# Altium footprint library Molex FFC - FPC Connectors (SMT).PcbLib: 638 footprints (part 33 of 40)
Each footprint in its own frame and in the unit in brackets; x right, y up, seen from the top. Pads: shape width x height; smd on the part's side, far side on the other; paste and mask are expansions set on the pad; w line width, h text height; cw(c..) or ccw(c..) is an arc to the next point about the centre after c.
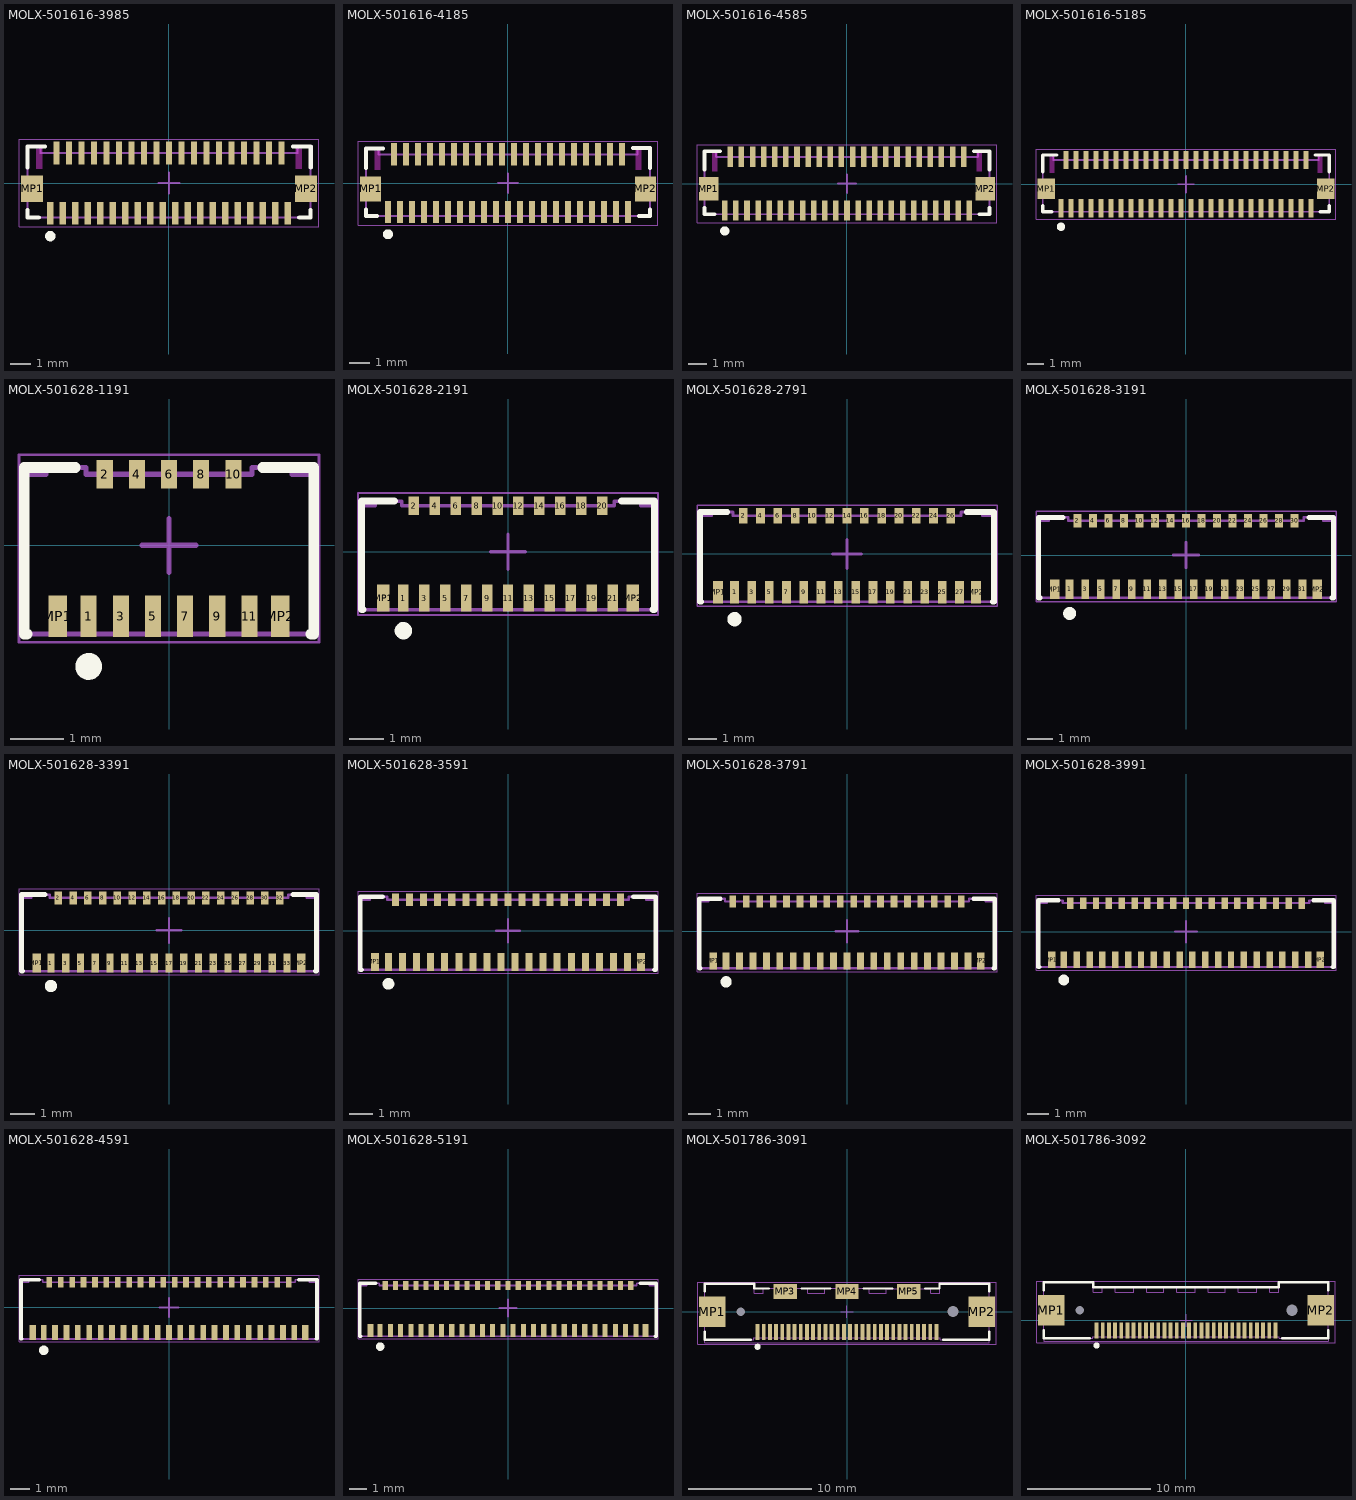
[diagram p32: the footprints below, top view; thin cyan lines are the x and y axes]

## MOLX-501616-3985 [mm] "FPC Connector, 39-Leads, Right Angle, Pitch 0.3 mm, Mated Height 1.1 mm, SMT"
height 1.112
pads (41):
  rect 0.3x1.1 smd: 1(-5.7,-1.45) 2(-5.4,1.45) 3(-5.1,-1.45) 4(-4.8,1.45) 5(-4.5,-1.45) 6(-4.2,1.45) 7(-3.9,-1.45) 8(-3.6,1.45) 9(-3.3,-1.45) 10(-3,1.45) 11(-2.7,-1.45) 12(-2.4,1.45) 13(-2.1,-1.45) 14(-1.8,1.45) 15(-1.5,-1.45) 16(-1.2,1.45) 17(-0.9,-1.45) 18(-0.6,1.45) 19(-0.3,-1.45) 20(0,1.45) 21(0.3,-1.45) 22(0.6,1.45) 23(0.9,-1.45) 24(1.2,1.45) 25(1.5,-1.45) 26(1.8,1.45) 27(2.1,-1.45) 28(2.4,1.45) 29(2.7,-1.45) 30(3,1.45) 31(3.3,-1.45) 32(3.6,1.45) 33(3.9,-1.45) 34(4.2,1.45) 35(4.5,-1.45) 36(4.8,1.45) 37(5.1,-1.45) 38(5.4,1.45) 39(5.7,-1.45)
  rect 1.05x1.25 smd: MP1(-6.575,-0.275) MP2(6.575,-0.275)
Top Overlay:
  circle w0.25: c-5.7,-2.55 r0.125
  lines w0.2: -6.8,-1.3 -6.8,-1.65 -6.25,-1.65 ; -6.8,0.75 -6.8,1.75 -5.95,1.75 ; 5.95,1.75 6.8,1.75 6.8,0.75 ; 6.25,-1.65 6.8,-1.65 6.8,-1.3
Keep-Out Layer:
  rectangle: 6.08,0.67 6.38,1.78
  rectangle: -6.38,0.67 -6.08,1.78
Mechanical 13:
  lines w0.1: -6.8,-1.65 -6.8,1.75 -6.17,1.75 -6.17,1.45 6.17,1.45 6.17,1.75 6.8,1.75 6.8,-1.65 -6.8,-1.65
Mechanical 15:
  lines w0.05: -7.2,-2.1 7.2,-2.1 7.2,2.1 -7.2,2.1 -7.2,-2.1
  lines w0.1: -0.5,0 0.5,0 ; 0,-0.5 0,0.5
3D body: height 0.25, standoff 0, extent -6.8,-1.7 6.8,1.75

## MOLX-501616-4185 [mm] "FPC Connector, 41-Leads, Right Angle, Pitch 0.3 mm, Mated Height 1.1 mm, SMT"
height 1.112
pads (43):
  rect 0.3x1.1 smd: 1(-6,-1.45) 2(-5.7,1.45) 3(-5.4,-1.45) 4(-5.1,1.45) 5(-4.8,-1.45) 6(-4.5,1.45) 7(-4.2,-1.45) 8(-3.9,1.45) 9(-3.6,-1.45) 10(-3.3,1.45) 11(-3,-1.45) 12(-2.7,1.45) 13(-2.4,-1.45) 14(-2.1,1.45) 15(-1.8,-1.45) 16(-1.5,1.45) 17(-1.2,-1.45) 18(-0.9,1.45) 19(-0.6,-1.45) 20(-0.3,1.45) 21(0,-1.45) 22(0.3,1.45) 23(0.6,-1.45) 24(0.9,1.45) 25(1.2,-1.45) 26(1.5,1.45) 27(1.8,-1.45) 28(2.1,1.45) 29(2.4,-1.45) 30(2.7,1.45) 31(3,-1.45) 32(3.3,1.45) 33(3.6,-1.45) 34(3.9,1.45) 35(4.2,-1.45) 36(4.5,1.45) 37(4.8,-1.45) 38(5.1,1.45) 39(5.4,-1.45) 40(5.7,1.45) 41(6,-1.45)
  rect 1.05x1.25 smd: MP1(-6.875,-0.275) MP2(6.875,-0.275)
Top Overlay:
  circle w0.25: c-6,-2.55 r0.125
  lines w0.2: -7.1,-1.3 -7.1,-1.65 -6.55,-1.65 ; -7.1,0.75 -7.1,1.75 -6.25,1.75 ; 6.25,1.75 7.1,1.75 7.1,0.75 ; 6.55,-1.65 7.1,-1.65 7.1,-1.3
Keep-Out Layer:
  rectangle: -6.68,0.67 -6.38,1.78
  rectangle: 6.38,0.67 6.68,1.78
Mechanical 13:
  lines w0.1: -7.1,-1.65 7.1,-1.65 7.1,1.75 6.47,1.75 6.47,1.45 -6.47,1.45 ; -7.1,1.75 -6.47,1.75 ; -7.1,-1.65 -7.1,1.75 ; -6.47,1.45 -6.47,1.75
Mechanical 15:
  lines w0.05: -7.5,-2.1 -7.5,2.1 7.5,2.1 7.5,-2.1 -7.5,-2.1
  lines w0.1: -0.5,0 0.5,0 ; 0,-0.5 0,0.5
3D body: height 0.25, standoff 0, extent -7.1,-1.7 7.1,1.75

## MOLX-501616-4585 [mm] "FPC Connector, 45-Leads, Right Angle, Pitch 0.3 mm, Mated Height 1.1 mm, SMT"
height 1.112
pads (47):
  rect 0.3x1.1 smd: 1(-6.6,-1.45) 2(-6.3,1.45) 3(-6,-1.45) 4(-5.7,1.45) 5(-5.4,-1.45) 6(-5.1,1.45) 7(-4.8,-1.45) 8(-4.5,1.45) 9(-4.2,-1.45) 10(-3.9,1.45) 11(-3.6,-1.45) 12(-3.3,1.45) 13(-3,-1.45) 14(-2.7,1.45) 15(-2.4,-1.45) 16(-2.1,1.45) 17(-1.8,-1.45) 18(-1.5,1.45) 19(-1.2,-1.45) 20(-0.9,1.45) 21(-0.6,-1.45) 22(-0.3,1.45) 23(0,-1.45) 24(0.3,1.45) 25(0.6,-1.45) 26(0.9,1.45) 27(1.2,-1.45) 28(1.5,1.45) 29(1.8,-1.45) 30(2.1,1.45) 31(2.4,-1.45) 32(2.7,1.45) 33(3,-1.45) 34(3.3,1.45) 35(3.6,-1.45) 36(3.9,1.45) 37(4.2,-1.45) 38(4.5,1.45) 39(4.8,-1.45) 40(5.1,1.45) 41(5.4,-1.45) 42(5.7,1.45) 43(6,-1.45) 44(6.3,1.45) 45(6.6,-1.45)
  rect 1.05x1.25 smd: MP1(-7.475,-0.275) MP2(7.475,-0.275)
Top Overlay:
  circle w0.25: c-6.6,-2.55 r0.125
  lines w0.2: -7.7,-1.3 -7.7,-1.65 -7.15,-1.65 ; -7.7,0.75 -7.7,1.75 -6.85,1.75 ; 6.85,1.75 7.7,1.75 7.7,0.75 ; 7.15,-1.65 7.7,-1.65 7.7,-1.3
Keep-Out Layer:
  rectangle: -7.28,0.67 -6.98,1.78
  rectangle: 6.98,0.67 7.28,1.78
Mechanical 13:
  lines w0.1: -7.7,-1.65 7.7,-1.65 7.7,1.75 7.07,1.75 7.07,1.45 -7.07,1.45 -7.07,1.75 -7.7,1.75 -7.7,-1.65
Mechanical 15:
  lines w0.05: -8.1,-2.1 -8.1,2.1 8.1,2.1 8.1,-2.1 -8.1,-2.1
  lines w0.1: -0.5,0 0.5,0 ; 0,-0.5 0,0.5
3D body: height 0.25, standoff 0, extent -7.7,-1.7 7.7,1.75

## MOLX-501616-5185 [mm] "FPC Connector, 51-Leads, Right Angle, Pitch 0.3 mm, Mated Height 1.1 mm, SMT"
height 1.112
pads (53):
  rect 0.3x1.1 smd: 1(-7.5,-1.45) 2(-7.2,1.45) 3(-6.9,-1.45) 4(-6.6,1.45) 5(-6.3,-1.45) 6(-6,1.45) 7(-5.7,-1.45) 8(-5.4,1.45) 9(-5.1,-1.45) 10(-4.8,1.45) 11(-4.5,-1.45) 12(-4.2,1.45) 13(-3.9,-1.45) 14(-3.6,1.45) 15(-3.3,-1.45) 16(-3,1.45) 17(-2.7,-1.45) 18(-2.4,1.45) 19(-2.1,-1.45) 20(-1.8,1.45) 21(-1.5,-1.45) 22(-1.2,1.45) 23(-0.9,-1.45) 24(-0.6,1.45) 25(-0.3,-1.45) 26(0,1.45) 27(0.3,-1.45) 28(0.6,1.45) 29(0.9,-1.45) 30(1.2,1.45) 31(1.5,-1.45) 32(1.8,1.45) 33(2.1,-1.45) 34(2.4,1.45) 35(2.7,-1.45) 36(3,1.45) 37(3.3,-1.45) 38(3.6,1.45) 39(3.9,-1.45) 40(4.2,1.45) 41(4.5,-1.45) 42(4.8,1.45) 43(5.1,-1.45) 44(5.4,1.45) 45(5.7,-1.45) 46(6,1.45) 47(6.3,-1.45) 48(6.6,1.45) 49(6.9,-1.45) 50(7.2,1.45) 51(7.5,-1.45)
  rect 1.05x1.25 smd: MP1(-8.375,-0.275) MP2(8.375,-0.275)
Top Overlay:
  circle w0.25: c-7.5,-2.55 r0.125
  lines w0.2: -8.6,-1.3 -8.6,-1.65 -8.05,-1.65 ; -8.6,0.75 -8.6,1.75 -7.75,1.75 ; 7.75,1.75 8.6,1.75 8.6,0.75 ; 8.05,-1.65 8.6,-1.65 8.6,-1.3
Keep-Out Layer:
  rectangle: -8.18,0.67 -7.88,1.78
  rectangle: 7.88,0.67 8.18,1.78
Mechanical 13:
  lines w0.1: -8.6,-1.65 8.6,-1.65 8.6,1.75 7.97,1.75 7.97,1.45 -7.97,1.45 -7.97,1.75 -8.6,1.75 ; -8.6,-1.65 -8.6,1.75
Mechanical 15:
  lines w0.05: -9,-2.1 -9,2.1 9,2.1 9,-2.1 -9,-2.1
  lines w0.1: -0.5,0 0.5,0 ; 0,-0.5 0,0.5
3D body: height 0.25, standoff 0, extent -8.6,-1.7 8.6,1.75

## MOLX-501628-1191 [mm] "FPC Connector, 11-Leads, Right Angle, Pitch 0.3 mm, Mated Height 0.9 mm, SMT"
height 0.912
pads (13):
  rect 0.3x0.77 smd: 1(-1.5,-1.325) 3(-0.9,-1.325) 5(-0.3,-1.325) 7(0.3,-1.325) 9(0.9,-1.325) 11(1.5,-1.325)
  rect 0.3x0.53 smd: 2(-1.2,1.325) 4(-0.6,1.325) 6(0,1.325) 8(0.6,1.325) 10(1.2,1.325)
  rect 0.35x0.77 smd: MP1(-2.075,-1.325) MP2(2.075,-1.325)
Top Overlay:
  circle w0.25: c-1.5,-2.26 r0.125
  lines w0.2: -2.65,-1.655 -2.7,-1.655 -2.7,1.455 -1.75,1.455 ; 1.75,1.455 2.7,1.455 2.7,-1.655 2.65,-1.655 ; -2.3,1.455 -2.3,1.455
Mechanical 13:
  lines w0.1: 2.4,-1.655 2.7,-1.655 ; 2.7,-1.655 -2.4,-1.655 -2.7,-1.655 -2.7,1.325 -2.3,1.325 -2.3,1.455 -1.55,1.455 -1.55,1.325 1.55,1.325 1.55,1.455 2.3,1.455 2.3,1.325 2.7,1.325 2.7,-1.655
Mechanical 15:
  lines w0.05: -2.8,-1.81 -2.8,1.69 2.8,1.69 2.8,-1.81 -2.8,-1.81
  lines w0.1: -0.5,0 0.5,0 ; 0,-0.5 0,0.5
3D body: height 0.25, standoff 0, extent -2.7,-1.655 2.7,1.455

## MOLX-501628-2191 [mm] "FPC Connector, 21-Leads, Right Angle, Pitch 0.3 mm, Mated Height 0.9 mm, SMT"
height 0.912
pads (23):
  rect 0.3x0.77 smd: 1(-3,-1.325) 3(-2.4,-1.325) 5(-1.8,-1.325) 7(-1.2,-1.325) 9(-0.6,-1.325) 11(0,-1.325) 13(0.6,-1.325) 15(1.2,-1.325) 17(1.8,-1.325) 19(2.4,-1.325) 21(3,-1.325)
  rect 0.3x0.53 smd: 2(-2.7,1.325) 4(-2.1,1.325) 6(-1.5,1.325) 8(-0.9,1.325) 10(-0.3,1.325) 12(0.3,1.325) 14(0.9,1.325) 16(1.5,1.325) 18(2.1,1.325) 20(2.7,1.325)
  rect 0.35x0.77 smd: MP1(-3.575,-1.325) MP2(3.575,-1.325)
Top Overlay:
  circle w0.25: c-3,-2.26 r0.125
  lines w0.2: -4.15,-1.655 -4.2,-1.655 -4.2,1.455 -3.25,1.455 ; 3.25,1.455 4.2,1.455 4.2,-1.655 4.15,-1.655 ; -3.8,1.455 -3.8,1.455
Mechanical 13:
  lines w0.1: -4.2,-1.655 -3.9,-1.655 3.9,-1.655 4.2,-1.655 4.2,1.325 3.8,1.325 3.8,1.455 3.05,1.455 3.05,1.325 -3.05,1.325 -3.05,1.455 -3.8,1.455 -3.8,1.325 -4.2,1.325 -4.2,-1.655
Mechanical 15:
  lines w0.05: -4.3,-1.81 4.3,-1.81 4.3,1.69 -4.3,1.69 -4.3,-1.81
  lines w0.1: -0.5,0 0.5,0 ; 0,-0.5 0,0.5
3D body: height 0.25, standoff 0, extent -4.2,-1.655 4.2,1.455

## MOLX-501628-2791 [mm] "FPC Connector, 27-Leads, Right Angle, Pitch 0.3 mm, Mated Height 0.9 mm, SMT"
height 0.912
pads (29):
  rect 0.3x0.77 smd: 1(-3.9,-1.325) 3(-3.3,-1.325) 5(-2.7,-1.325) 7(-2.1,-1.325) 9(-1.5,-1.325) 11(-0.9,-1.325) 13(-0.3,-1.325) 15(0.3,-1.325) 17(0.9,-1.325) 19(1.5,-1.325) 21(2.1,-1.325) 23(2.7,-1.325) 25(3.3,-1.325) 27(3.9,-1.325)
  rect 0.3x0.53 smd: 2(-3.6,1.325) 4(-3,1.325) 6(-2.4,1.325) 8(-1.8,1.325) 10(-1.2,1.325) 12(-0.6,1.325) 14(0,1.325) 16(0.6,1.325) 18(1.2,1.325) 20(1.8,1.325) 22(2.4,1.325) 24(3,1.325) 26(3.6,1.325)
  rect 0.35x0.77 smd: MP1(-4.475,-1.325) MP2(4.475,-1.325)
Top Overlay:
  circle w0.25: c-3.9,-2.26 r0.125
  lines w0.2: -5.05,-1.655 -5.1,-1.655 -5.1,1.455 -4.15,1.455 ; 4.15,1.455 5.1,1.455 5.1,-1.655 5.05,-1.655 ; -4.7,1.455 -4.7,1.455
Mechanical 13:
  lines w0.1: -5.1,-1.655 -5.1,1.325 -4.7,1.325 -4.7,1.455 -3.95,1.455 -3.95,1.325 3.95,1.325 3.95,1.455 4.7,1.455 4.7,1.325 5.1,1.325 5.1,-1.655 4.8,-1.655 -4.8,-1.655 -5.1,-1.655
Mechanical 15:
  lines w0.05: -5.2,-1.81 -5.2,1.69 5.2,1.69 5.2,-1.81 -5.2,-1.81
  lines w0.1: -0.5,0 0.5,0 ; 0,-0.5 0,0.5
3D body: height 0.25, standoff 0, extent -5.1,-1.655 5.1,1.455

## MOLX-501628-3191 [mm] "FPC Connector, 31-Leads, Right Angle, Pitch 0.3 mm, Mated Height 0.9 mm, SMT"
height 0.912
pads (33):
  rect 0.3x0.77 smd: 1(-4.5,-1.325) 3(-3.9,-1.325) 5(-3.3,-1.325) 7(-2.7,-1.325) 9(-2.1,-1.325) 11(-1.5,-1.325) 13(-0.9,-1.325) 15(-0.3,-1.325) 17(0.3,-1.325) 19(0.9,-1.325) 21(1.5,-1.325) 23(2.1,-1.325) 25(2.7,-1.325) 27(3.3,-1.325) 29(3.9,-1.325) 31(4.5,-1.325)
  rect 0.3x0.53 smd: 2(-4.2,1.325) 4(-3.6,1.325) 6(-3,1.325) 8(-2.4,1.325) 10(-1.8,1.325) 12(-1.2,1.325) 14(-0.6,1.325) 16(0,1.325) 18(0.6,1.325) 20(1.2,1.325) 22(1.8,1.325) 24(2.4,1.325) 26(3,1.325) 28(3.6,1.325) 30(4.2,1.325)
  rect 0.35x0.77 smd: MP1(-5.075,-1.325) MP2(5.075,-1.325)
Top Overlay:
  circle w0.25: c-4.5,-2.26 r0.125
  lines w0.2: -5.65,-1.655 -5.7,-1.655 -5.7,1.455 -4.75,1.455 ; 4.75,1.455 5.7,1.455 5.7,-1.655 5.65,-1.655 ; -5.3,1.455 -5.3,1.455
Mechanical 13:
  lines w0.1: -5.7,-1.655 -5.7,1.325 -5.3,1.325 -5.3,1.455 -4.55,1.455 -4.55,1.325 4.55,1.325 4.55,1.455 5.3,1.455 5.3,1.325 5.7,1.325 5.7,-1.655 5.4,-1.655 -5.4,-1.655 -5.7,-1.655
Mechanical 15:
  lines w0.05: -5.8,-1.81 -5.8,1.69 5.8,1.69 5.8,-1.81 -5.8,-1.81
  lines w0.1: -0.5,0 0.5,0 ; 0,-0.5 0,0.5
3D body: height 0.25, standoff 0, extent -5.7,-1.655 5.7,1.455

## MOLX-501628-3391 [mm] "FPC Connector, 33-Leads, Right Angle, Pitch 0.3 mm, Mated Height 0.9 mm, SMT"
height 0.912
pads (35):
  rect 0.3x0.77 smd: 1(-4.8,-1.325) 3(-4.2,-1.325) 5(-3.6,-1.325) 7(-3,-1.325) 9(-2.4,-1.325) 11(-1.8,-1.325) 13(-1.2,-1.325) 15(-0.6,-1.325) 17(0,-1.325) 19(0.6,-1.325) 21(1.2,-1.325) 23(1.8,-1.325) 25(2.4,-1.325) 27(3,-1.325) 29(3.6,-1.325) 31(4.2,-1.325) 33(4.8,-1.325)
  rect 0.3x0.53 smd: 2(-4.5,1.325) 4(-3.9,1.325) 6(-3.3,1.325) 8(-2.7,1.325) 10(-2.1,1.325) 12(-1.5,1.325) 14(-0.9,1.325) 16(-0.3,1.325) 18(0.3,1.325) 20(0.9,1.325) 22(1.5,1.325) 24(2.1,1.325) 26(2.7,1.325) 28(3.3,1.325) 30(3.9,1.325) 32(4.5,1.325)
  rect 0.35x0.77 smd: MP1(-5.375,-1.325) MP2(5.375,-1.325)
Top Overlay:
  circle w0.25: c-4.8,-2.26 r0.125
  lines w0.2: -5.95,-1.655 -6,-1.655 -6,1.455 -5.05,1.455 ; 5.05,1.455 6,1.455 6,-1.655 ; 5.95,-1.655 6,-1.655 ; -5.6,1.455 -5.6,1.455
Mechanical 13:
  lines w0.1: -6,-1.655 -5.7,-1.655 5.7,-1.655 6,-1.655 6,1.325 5.6,1.325 5.6,1.455 4.85,1.455 4.85,1.325 -4.85,1.325 -4.85,1.455 -5.6,1.455 -5.6,1.325 -6,1.325 -6,-1.655
Mechanical 15:
  lines w0.05: -6.1,-1.81 6.1,-1.81 6.1,1.69 -6.1,1.69 -6.1,-1.81
  lines w0.1: -0.5,0 0.5,0 ; 0,-0.5 0,0.5
3D body: height 0.25, standoff 0, extent -6,-1.655 6,1.455

## MOLX-501628-3591 [mm] "FPC Connector, 35-Leads, Right Angle, Pitch 0.3 mm, Mated Height 0.9 mm, SMT"
height 0.912
pads (37):
  rect 0.3x0.77 smd: 1(-5.1,-1.325) 3(-4.5,-1.325) 5(-3.9,-1.325) 7(-3.3,-1.325) 9(-2.7,-1.325) 11(-2.1,-1.325) 13(-1.5,-1.325) 15(-0.9,-1.325) 17(-0.3,-1.325) 19(0.3,-1.325) 21(0.9,-1.325) 23(1.5,-1.325) 25(2.1,-1.325) 27(2.7,-1.325) 29(3.3,-1.325) 31(3.9,-1.325) 33(4.5,-1.325) 35(5.1,-1.325)
  rect 0.3x0.53 smd: 2(-4.8,1.325) 4(-4.2,1.325) 6(-3.6,1.325) 8(-3,1.325) 10(-2.4,1.325) 12(-1.8,1.325) 14(-1.2,1.325) 16(-0.6,1.325) 18(0,1.325) 20(0.6,1.325) 22(1.2,1.325) 24(1.8,1.325) 26(2.4,1.325) 28(3,1.325) 30(3.6,1.325) 32(4.2,1.325) 34(4.8,1.325)
  rect 0.35x0.77 smd: MP1(-5.675,-1.325) MP2(5.675,-1.325)
Top Overlay:
  circle w0.25: c-5.1,-2.26 r0.125
  lines w0.2: -6.25,-1.655 -6.3,-1.655 -6.3,1.455 -5.35,1.455 ; 5.35,1.455 6.3,1.455 6.3,-1.655 6.25,-1.655 ; -5.9,1.455 -5.9,1.455
Mechanical 13:
  lines w0.1: 6,-1.655 6.3,-1.655 ; 6.3,-1.655 -6,-1.655 -6.3,-1.655 -6.3,1.325 -5.9,1.325 -5.9,1.455 -5.15,1.455 -5.15,1.325 5.15,1.325 5.15,1.455 5.9,1.455 5.9,1.325 6.3,1.325 6.3,-1.655
Mechanical 15:
  lines w0.05: -6.4,-1.81 -6.4,1.69 6.4,1.69 6.4,-1.81 -6.4,-1.81
  lines w0.1: -0.5,0 0.5,0 ; 0,-0.5 0,0.5
3D body: height 0.25, standoff 0, extent -6.3,-1.655 6.3,1.455

## MOLX-501628-3791 [mm] "FPC Connector, 37-Leads, Right Angle, Pitch 0.3 mm, Mated Height 0.9 mm, SMT"
height 0.912
pads (39):
  rect 0.3x0.77 smd: 1(-5.4,-1.325) 3(-4.8,-1.325) 5(-4.2,-1.325) 7(-3.6,-1.325) 9(-3,-1.325) 11(-2.4,-1.325) 13(-1.8,-1.325) 15(-1.2,-1.325) 17(-0.6,-1.325) 19(0,-1.325) 21(0.6,-1.325) 23(1.2,-1.325) 25(1.8,-1.325) 27(2.4,-1.325) 29(3,-1.325) 31(3.6,-1.325) 33(4.2,-1.325) 35(4.8,-1.325) 37(5.4,-1.325)
  rect 0.3x0.53 smd: 2(-5.1,1.325) 4(-4.5,1.325) 6(-3.9,1.325) 8(-3.3,1.325) 10(-2.7,1.325) 12(-2.1,1.325) 14(-1.5,1.325) 16(-0.9,1.325) 18(-0.3,1.325) 20(0.3,1.325) 22(0.9,1.325) 24(1.5,1.325) 26(2.1,1.325) 28(2.7,1.325) 30(3.3,1.325) 32(3.9,1.325) 34(4.5,1.325) 36(5.1,1.325)
  rect 0.35x0.77 smd: MP1(-5.975,-1.325) MP2(5.975,-1.325)
Top Overlay:
  circle w0.25: c-5.4,-2.26 r0.125
  lines w0.2: -6.55,-1.655 -6.6,-1.655 -6.6,1.455 -5.65,1.455 ; 5.65,1.455 6.6,1.455 6.6,-1.655 6.55,-1.655 ; -6.2,1.455 -6.2,1.455
Mechanical 13:
  lines w0.1: -6.6,-1.655 -6.6,1.325 -6.2,1.325 -6.2,1.455 -5.45,1.455 -5.45,1.325 5.45,1.325 5.45,1.455 6.2,1.455 6.2,1.325 6.6,1.325 6.6,-1.655 6.3,-1.655 -6.3,-1.655 -6.6,-1.655
Mechanical 15:
  lines w0.05: -6.7,-1.81 -6.7,1.69 6.7,1.69 6.7,-1.81 -6.7,-1.81
  lines w0.1: -0.5,0 0.5,0 ; 0,-0.5 0,0.5
3D body: height 0.25, standoff 0, extent -6.6,-1.655 6.6,1.455

## MOLX-501628-3991 [mm] "FPC Connector, 39-Leads, Right Angle, Pitch 0.3 mm, Mated Height 0.9 mm, SMT"
height 0.912
pads (41):
  rect 0.3x0.77 smd: 1(-5.7,-1.325) 3(-5.1,-1.325) 5(-4.5,-1.325) 7(-3.9,-1.325) 9(-3.3,-1.325) 11(-2.7,-1.325) 13(-2.1,-1.325) 15(-1.5,-1.325) 17(-0.9,-1.325) 19(-0.3,-1.325) 21(0.3,-1.325) 23(0.9,-1.325) 25(1.5,-1.325) 27(2.1,-1.325) 29(2.7,-1.325) 31(3.3,-1.325) 33(3.9,-1.325) 35(4.5,-1.325) 37(5.1,-1.325) 39(5.7,-1.325)
  rect 0.3x0.53 smd: 2(-5.4,1.325) 4(-4.8,1.325) 6(-4.2,1.325) 8(-3.6,1.325) 10(-3,1.325) 12(-2.4,1.325) 14(-1.8,1.325) 16(-1.2,1.325) 18(-0.6,1.325) 20(0,1.325) 22(0.6,1.325) 24(1.2,1.325) 26(1.8,1.325) 28(2.4,1.325) 30(3,1.325) 32(3.6,1.325) 34(4.2,1.325) 36(4.8,1.325) 38(5.4,1.325)
  rect 0.35x0.77 smd: MP1(-6.275,-1.325) MP2(6.275,-1.325)
Top Overlay:
  circle w0.25: c-5.7,-2.26 r0.125
  lines w0.2: -6.85,-1.655 -6.9,-1.655 -6.9,1.455 -5.95,1.455 ; 5.95,1.455 6.9,1.455 6.9,-1.655 6.85,-1.655 ; -6.5,1.455 -6.5,1.455
Mechanical 13:
  lines w0.1: -6.9,-1.655 -6.6,-1.655 6.6,-1.655 6.9,-1.655 6.9,1.325 6.5,1.325 6.5,1.455 5.75,1.455 5.75,1.325 -5.75,1.325 -5.75,1.455 -6.5,1.455 -6.5,1.325 -6.9,1.325 -6.9,-1.655
Mechanical 15:
  lines w0.05: -7,-1.81 7,-1.81 7,1.69 -7,1.69 -7,-1.81
  lines w0.1: -0.5,0 0.5,0 ; 0,-0.5 0,0.5
3D body: height 0.25, standoff 0, extent -6.9,-1.655 6.9,1.455

## MOLX-501628-4591 [mm] "FPC Connector, 45-Leads, Right Angle, Pitch 0.3 mm, Mated Height 0.9 mm, SMT"
height 0.912
pads (47):
  rect 0.3x0.77 smd: 1(-6.6,-1.325) 3(-6,-1.325) 5(-5.4,-1.325) 7(-4.8,-1.325) 9(-4.2,-1.325) 11(-3.6,-1.325) 13(-3,-1.325) 15(-2.4,-1.325) 17(-1.8,-1.325) 19(-1.2,-1.325) 21(-0.6,-1.325) 23(0,-1.325) 25(0.6,-1.325) 27(1.2,-1.325) 29(1.8,-1.325) 31(2.4,-1.325) 33(3,-1.325) 35(3.6,-1.325) 37(4.2,-1.325) 39(4.8,-1.325) 41(5.4,-1.325) 43(6,-1.325) 45(6.6,-1.325)
  rect 0.3x0.53 smd: 2(-6.3,1.325) 4(-5.7,1.325) 6(-5.1,1.325) 8(-4.5,1.325) 10(-3.9,1.325) 12(-3.3,1.325) 14(-2.7,1.325) 16(-2.1,1.325) 18(-1.5,1.325) 20(-0.9,1.325) 22(-0.3,1.325) 24(0.3,1.325) 26(0.9,1.325) 28(1.5,1.325) 30(2.1,1.325) 32(2.7,1.325) 34(3.3,1.325) 36(3.9,1.325) 38(4.5,1.325) 40(5.1,1.325) 42(5.7,1.325) 44(6.3,1.325)
  rect 0.35x0.77 smd: MP1(-7.175,-1.325) MP2(7.175,-1.325)
Top Overlay:
  circle w0.25: c-6.6,-2.26 r0.125
  lines w0.2: -7.75,-1.655 -7.8,-1.655 -7.8,1.455 -6.85,1.455 ; 6.85,1.455 7.8,1.455 7.8,-1.655 7.75,-1.655 ; -7.4,1.455 -7.4,1.455
Mechanical 13:
  lines w0.1: -7.8,-1.655 -7.8,1.325 -7.4,1.325 -7.4,1.455 -6.65,1.455 -6.65,1.325 6.65,1.325 6.65,1.455 7.4,1.455 7.4,1.325 7.8,1.325 7.8,-1.655 7.5,-1.655 -7.5,-1.655 -7.8,-1.655
Mechanical 15:
  lines w0.05: -7.9,-1.81 -7.9,1.69 7.9,1.69 7.9,-1.81 -7.9,-1.81
  lines w0.1: -0.5,0 0.5,0 ; 0,-0.5 0,0.5
3D body: height 0.25, standoff 0, extent -7.8,-1.655 7.8,1.455

## MOLX-501628-5191 [mm] "FPC Connector, 51-Leads, Right Angle, Pitch 0.3 mm, Mated Height 0.9 mm, SMT"
height 0.912
pads (53):
  rect 0.3x0.77 smd: 1(-7.5,-1.325) 3(-6.9,-1.325) 5(-6.3,-1.325) 7(-5.7,-1.325) 9(-5.1,-1.325) 11(-4.5,-1.325) 13(-3.9,-1.325) 15(-3.3,-1.325) 17(-2.7,-1.325) 19(-2.1,-1.325) 21(-1.5,-1.325) 23(-0.9,-1.325) 25(-0.3,-1.325) 27(0.3,-1.325) 29(0.9,-1.325) 31(1.5,-1.325) 33(2.1,-1.325) 35(2.7,-1.325) 37(3.3,-1.325) 39(3.9,-1.325) 41(4.5,-1.325) 43(5.1,-1.325) 45(5.7,-1.325) 47(6.3,-1.325) 49(6.9,-1.325) 51(7.5,-1.325)
  rect 0.3x0.53 smd: 2(-7.2,1.325) 4(-6.6,1.325) 6(-6,1.325) 8(-5.4,1.325) 10(-4.8,1.325) 12(-4.2,1.325) 14(-3.6,1.325) 16(-3,1.325) 18(-2.4,1.325) 20(-1.8,1.325) 22(-1.2,1.325) 24(-0.6,1.325) 26(0,1.325) 28(0.6,1.325) 30(1.2,1.325) 32(1.8,1.325) 34(2.4,1.325) 36(3,1.325) 38(3.6,1.325) 40(4.2,1.325) 42(4.8,1.325) 44(5.4,1.325) 46(6,1.325) 48(6.6,1.325) 50(7.2,1.325)
  rect 0.35x0.77 smd: MP1(-8.075,-1.325) MP2(8.075,-1.325)
Top Overlay:
  circle w0.25: c-7.5,-2.26 r0.125
  lines w0.2: -8.65,-1.655 -8.7,-1.655 -8.7,1.455 -7.75,1.455 ; 7.75,1.455 8.7,1.455 8.7,-1.655 8.65,-1.655 ; -8.3,1.455 -8.3,1.455
Mechanical 13:
  lines w0.1: -8.7,-1.655 -8.7,1.325 -8.3,1.325 -8.3,1.455 -7.55,1.455 -7.55,1.325 7.55,1.325 7.55,1.455 8.3,1.455 8.3,1.325 8.7,1.325 8.7,-1.655 8.4,-1.655 -8.4,-1.655 -8.7,-1.655
Mechanical 15:
  lines w0.05: -8.8,-1.81 -8.8,1.69 8.8,1.69 8.8,-1.81 -8.8,-1.81
  lines w0.1: -0.5,0.005 0.5,0.005 ; 0,-0.495 0,0.505
3D body: height 0.25, standoff 0, extent -8.7,-1.655 8.7,1.455

## MOLX-501786-3091 [mm] "FFC Connector, 30-Leads, Vertical, Pitch 0.5 mm, Mated Height 8.95 mm, SMT"
height 7.512
pads (37):
  rect 0.3x1.3 smd: 1(-7.25,-1.645) 2(-6.75,-1.645) 3(-6.25,-1.645) 4(-5.75,-1.645) 5(-5.25,-1.645) 6(-4.75,-1.645) 7(-4.25,-1.645) 8(-3.75,-1.645) 9(-3.25,-1.645) 10(-2.75,-1.645) 11(-2.25,-1.645) 12(-1.75,-1.645) 13(-1.25,-1.645) 14(-0.75,-1.645) 15(-0.25,-1.645) 16(0.25,-1.645) 17(0.75,-1.645) 18(1.25,-1.645) 19(1.75,-1.645) 20(2.25,-1.645) 21(2.75,-1.645) 22(3.25,-1.645) 23(3.75,-1.645) 24(4.25,-1.645) 25(4.75,-1.645) 26(5.25,-1.645) 27(5.75,-1.645) 28(6.25,-1.645) 29(6.75,-1.645) 30(7.25,-1.645)
  round 0.4 hole 0.7 unplated: MH1(-8.6,0.005)
  round 0.6 hole 0.9 unplated: MH2(8.6,0.005)
  rect 2.15x2.47 smd: MP1(-10.925,0.005) MP2(10.925,0.005)
  rect 1.9x1.2 smd: MP3(-5,1.645) MP4(0,1.645) MP5(5,1.645)
Top Overlay:
  circle w0.25: c-7.25,-2.845 r0.125
  lines w0.2: -11.55,-1.63 -11.55,-2.27 -7.8,-2.27 ; -11.55,1.64 -11.55,2.28 -7.501,2.28 -7.501,1.88 -6.35,1.88 ; -3.65,1.88 -1.35,1.88 ; 1.35,1.88 3.65,1.88 ; 6.35,1.88 7.5,1.88 7.5,2.28 11.55,2.28 11.55,1.64 ; 7.8,-2.27 11.549,-2.27 11.549,-1.63
Mechanical 13:
  lines w0.1: -11.55,-2.27 -7.55,-2.27 -7.55,-2.12 7.55,-2.12 7.55,-2.27 11.549,-2.27 ; 3.2,1.88 3.2,1.48 1.8,1.48 1.8,1.88 -1.801,1.88 -1.801,1.48 -3.2,1.48 -3.2,1.88 -6.8,1.88 -6.8,1.48 -7.501,1.48 -7.501,2.28 -11.55,2.28 -11.55,-2.52 11.55,-2.52 11.55,2.28 7.5,2.28 ; 3.2,1.879 6.8,1.879 6.8,1.48 7.5,1.48 7.5,2.28
Mechanical 15:
  lines w0.05: -12.1,-2.62 -12.1,2.38 12.1,2.38 12.1,-2.62 -12.1,-2.62
  lines w0.1: -0.5,0 0.5,0 ; 0,-0.5 0,0.5
3D body: height 0.25, standoff 0, extent -11.55,-2.52 11.55,2.28

## MOLX-501786-3092 [mm] "FFC Connector, 30-Leads, Vertical, Pitch 0.5 mm, Mated Height 8.95 mm, SMT"
height 7.512
pads (34):
  rect 0.3x1.3 smd: 1(-7.25,-0.825) 2(-6.75,-0.825) 3(-6.25,-0.825) 4(-5.75,-0.825) 5(-5.25,-0.825) 6(-4.75,-0.825) 7(-4.25,-0.825) 8(-3.75,-0.825) 9(-3.25,-0.825) 10(-2.75,-0.825) 11(-2.25,-0.825) 12(-1.75,-0.825) 13(-1.25,-0.825) 14(-0.75,-0.825) 15(-0.25,-0.825) 16(0.25,-0.825) 17(0.75,-0.825) 18(1.25,-0.825) 19(1.75,-0.825) 20(2.25,-0.825) 21(2.75,-0.825) 22(3.25,-0.825) 23(3.75,-0.825) 24(4.25,-0.825) 25(4.75,-0.825) 26(5.25,-0.825) 27(5.75,-0.825) 28(6.25,-0.825) 29(6.75,-0.825) 30(7.25,-0.825)
  round 0.4 hole 0.7 unplated: MH1(-8.6,0.825)
  round 0.6 hole 0.9 unplated: MH2(8.6,0.825)
  rect 2.15x2.47 smd: MP1(-10.925,0.825) MP2(10.925,0.825)
Top Overlay:
  circle w0.25: c-7.25,-2.025 r0.125
  lines w0.2: -11.55,-0.81 -11.55,-1.45 -7.8,-1.45 ; -11.55,2.46 -11.55,3.1 -7.5,3.1 -7.5,2.7 7.501,2.7 7.501,3.1 11.55,3.1 11.55,2.46 ; 7.8,-1.45 11.55,-1.45 11.55,-0.81
Mechanical 13:
  lines w0.1: -11.55,-1.45 -11.55,-1.7 11.55,-1.7 11.55,-1.45 ; 11.55,-1.45 7.55,-1.45 7.55,-1.3 -7.55,-1.3 -7.55,-1.45 -11.55,-1.45 -11.55,3.1 -7.5,3.1 -7.5,2.3 -6.8,2.3 -6.8,2.7 -5.75,2.7 -5.75,2.3 -4.25,2.3 -4.25,2.7 -3.2,2.7 -3.2,2.3 -1.8,2.3 -1.8,2.7 -0.75,2.7 -0.75,2.3 0.75,2.3 0.75,2.7 1.8,2.7 1.8,2.3 3.2,2.3 3.2,2.7 4.25,2.7 4.25,2.3 5.75,2.3 5.75,2.7 6.8,2.7 6.8,2.3 7.5,2.3 7.5,3.1 11.55,3.1 11.55,-1.45
Mechanical 15:
  lines w0.05: -12.1,-1.8 -12.1,3.2 12.1,3.2 12.1,-1.8 -12.1,-1.8
  lines w0.1: -0.5,0 0.5,0 ; 0,-0.5 0,0.5
3D body: height 0.25, standoff 0, extent -11.55,-1.7 11.55,3.1